# Altium footprint library hphonglib.PcbLib: 1250 footprints (part 38 of 79)
Each footprint in its own frame and in the unit in brackets; x right, y up, seen from the top. Pads: shape width x height; smd on the part's side, far side on the other; paste and mask are expansions set on the pad; w line width, h text height; cw(c..) or ccw(c..) is an arc to the next point about the centre after c.
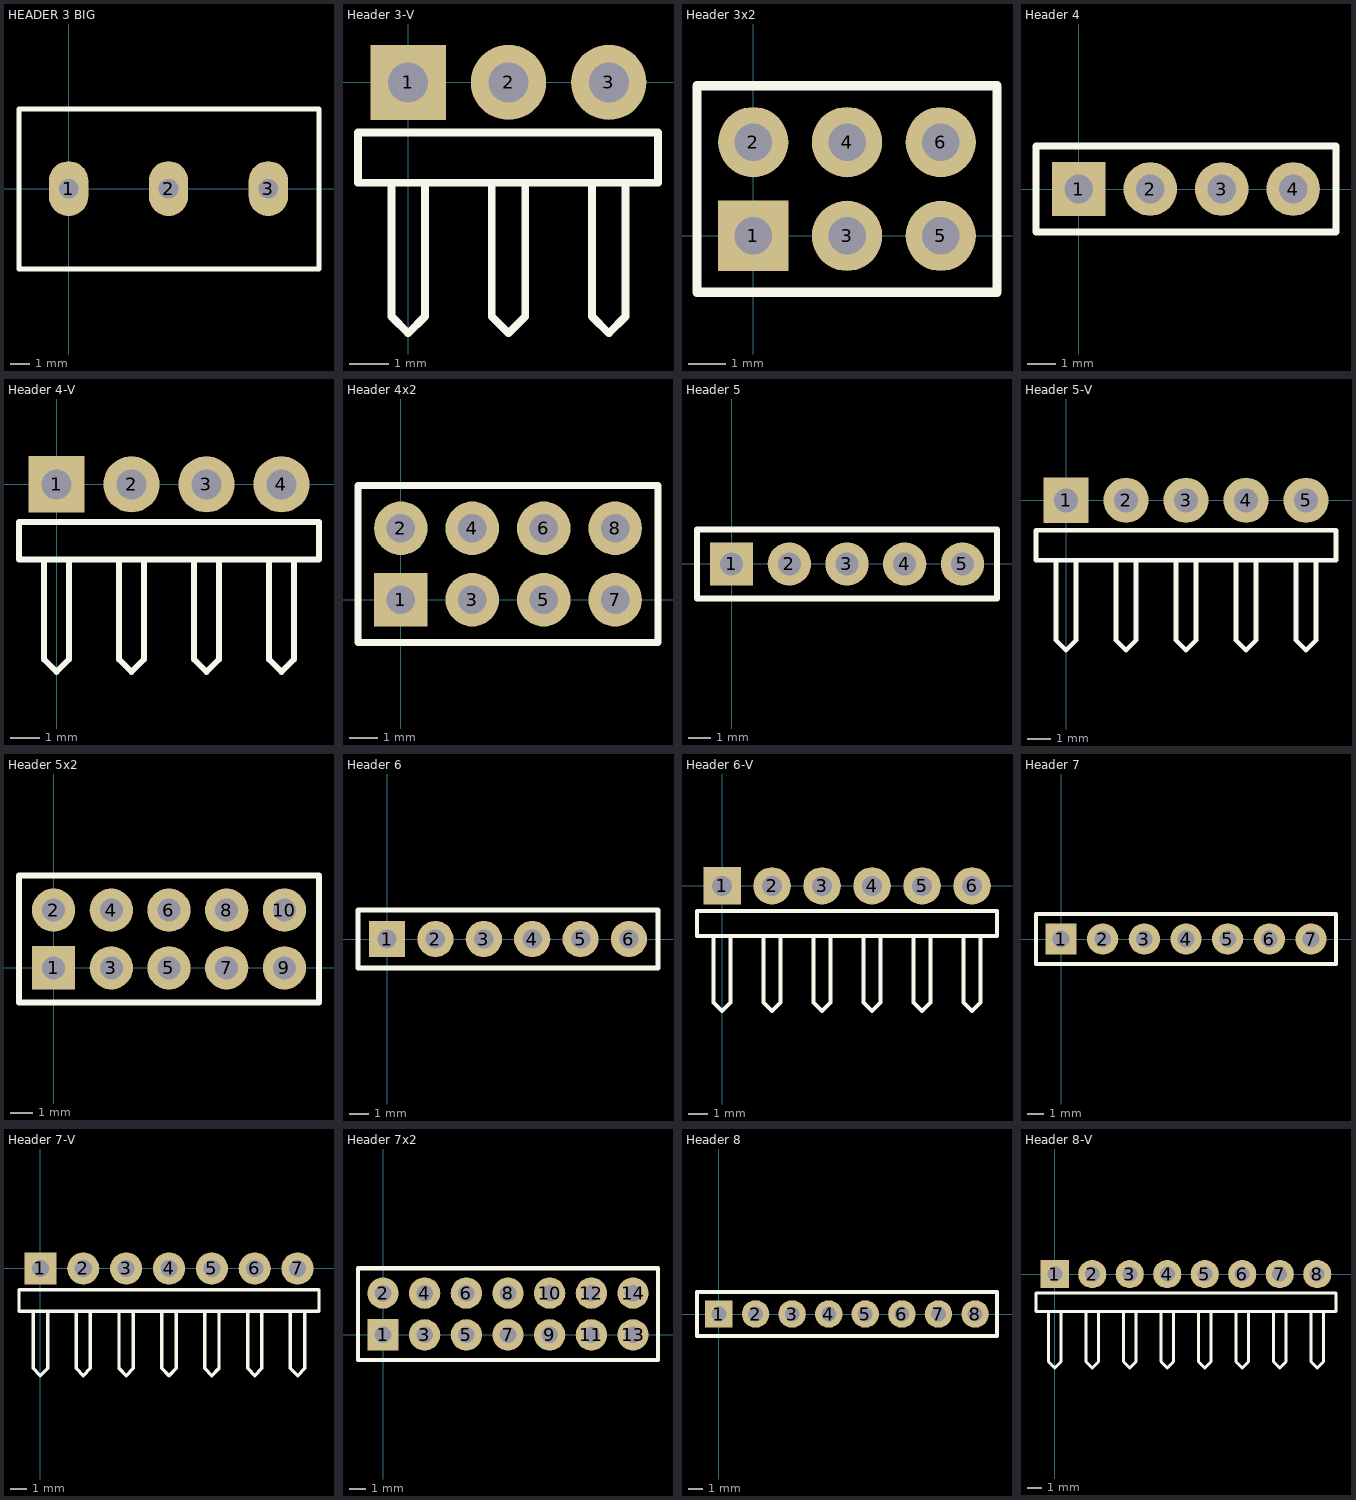
[diagram p37: the footprints below, top view; thin cyan lines are the x and y axes]

## HEADER 3 BIG [mm]
pads (3):
  oval 2x2.8 hole 1: 1(0,0) 2(5.08,0) 3(10.16,0)
Top Overlay:
  lines w0.254: -2.527,-4.102 -2.527,4.064 12.738,4.064 12.738,-4.102 -2.527,-4.102

## Header 3-V [mil] "Connector; Header; 3 Position; Vertical; Solder Pad 35mil"
pads (3):
  rect 75x75 hole 40: 1(0,0)
  round 75 hole 40: 2(100,0) 3(200,0)
Top Overlay:
  lines w7.87: -16.67,-100 -16.67,-233.33 0,-250 16.67,-233.33 16.67,-100 ; 83.33,-100 83.33,-233.33 100,-250 116.67,-233.33 116.67,-100 ; 183.33,-100 183.33,-233.33 200,-250 216.67,-233.33 216.67,-100 ; -50,-100 -50,-50 249,-50 249,-100 -50,-100
3D body "User Library-0_1inch pin strip right angle (2).step": height 171.28, standoff -117.11, extent -50,-275.59 250,50

## Header 3x2 [mil] "Connector; Header; 6 Position; 2 Row; Solder Pad 35mil"
pads (6):
  rect 75x75 hole 40: 1(0,0)
  round 75 hole 40: 2(0,100) 3(100,0) 4(100,100) 5(200,0) 6(200,100)
Top Overlay:
  lines w10: -60,-60 -60,160 260,160 260,-60 -60,-60
3D body "Samtec-TSW-103-07-G-D.step": height 83, standoff -347, extent -49.99,-49.99 250.01,150.01

## Header 4 [mil] "Connector; Header; 4 Position; Solder Pad 35mil"
pads (4):
  rect 75x75 hole 40: 1(0,0)
  round 75 hole 40: 2(100,0) 3(200,0) 4(300,0)
Top Overlay:
  lines w10: -60,-60 360,-60 360,60 -60,60 -60,-60
3D body "Samtec-TSW-104-07-G-S.step": height 330, standoff -100, extent -50,-50 350,50

## Header 4-V [mil] "Connector; Header; 4 Position; Vertical; Solder Pad 35mil"
pads (4):
  rect 75x75 hole 40: 1(0,0)
  round 75 hole 40: 2(100,0) 3(200,0) 4(300,0)
Top Overlay:
  lines w7.87: -16.67,-100 -16.67,-233.33 0,-250 16.67,-233.33 16.67,-100 ; 83.33,-100 83.33,-233.33 100,-250 116.67,-233.33 116.67,-100 ; 183.33,-100 183.33,-233.33 200,-250 216.67,-233.33 216.67,-100 ; 283.33,-100 283.33,-233.33 300,-250 316.67,-233.33 316.67,-100 ; -50,-100 -50,-50 350,-50 350,-100 -50,-100
3D body "User Library-0_1inch pin strip right angle (3).step": height 171.28, standoff -117.11, extent -50,-275.59 350,50

## Header 4x2 [mil] "Connector; Header; 8 Position; 2 Rows; Solder Pad 35mil"
pads (8):
  rect 75x75 hole 40: 1(0,0)
  round 75 hole 40: 2(0,100) 3(100,0) 4(100,100) 5(200,0) 6(200,100) 7(300,0) 8(300,100)
Top Overlay:
  lines w10: -60,-60 -60,160 360,160 360,-60 -60,-60
3D body "Samtec-TSW-104-07-G-D.step": height 83, standoff -347, extent -49.99,-49.99 350.01,150.01

## Header 5 [mil] "Connector; Header; 5 Position; Solder Pad 35mil"
pads (5):
  rect 75x75 hole 40: 1(0,0)
  round 75 hole 40: 2(100,0) 3(200,0) 4(300,0) 5(400,0)
Top Overlay:
  lines w10: -60,-60 460,-60 460,60 -60,60 -60,-60
3D body "Samtec-TSW-105-07-G-S.step": height 83, standoff -347, extent -49.99,-49.99 450.01,50.01

## Header 5-V [mil] "Connector; Header; 5 Position; Vertical; Solder Pad 35mil"
pads (5):
  rect 75x75 hole 40: 1(0,0)
  round 75 hole 40: 2(100,0) 3(200,0) 4(300,0) 5(400,0)
Top Overlay:
  lines w7.87: -16.67,-100 -16.67,-233.33 0,-250 16.67,-233.33 16.67,-100 ; 83.33,-100 83.33,-233.33 100,-250 116.67,-233.33 116.67,-100 ; 183.33,-100 183.33,-233.33 200,-250 216.67,-233.33 216.67,-100 ; 283.33,-100 283.33,-233.33 300,-250 316.67,-233.33 316.67,-100 ; 383.33,-100 383.33,-233.33 400,-250 416.67,-233.33 416.67,-100 ; -50,-100 450,-100 450,-50 -50,-50 -50,-100
3D body "User Library-0_1inch pin strip right angle (4).step": height 171.28, standoff -117.11, extent -50,-275.59 450,50

## Header 5x2 [mil] "Connector; Header; 10 Position; 2 Rows; Solder Pad 35mil"
pads (10):
  rect 75x75 hole 40: 1(0,0)
  round 75 hole 40: 2(0,100) 3(100,0) 4(100,100) 5(200,0) 6(200,100) 7(300,0) 8(300,100) 9(400,0) 10(400,100)
Top Overlay:
  lines w10: -60,-60 460,-60 460,160 -60,160 -60,-60
3D body "Samtec-TSW-105-07-G-D.step": height 83, standoff -347, extent -49.99,-50 450.01,150

## Header 6 [mil] "Connector; Header; 6 Position; Solder Pad 35mil"
pads (6):
  rect 75x75 hole 40: 1(0,0)
  round 75 hole 40: 2(100,0) 3(200,0) 4(300,0) 5(400,0) 6(500,0)
Top Overlay:
  lines w10: -60,-60 -60,60 560,60 560,-60 -60,-60
3D body "Samtec-TSW-106-07-G-S.step": height 330, standoff -100, extent -49.99,-49.99 550.01,50.01

## Header 6-V [mil] "Connector; Header; 6 Position; Vertical; Solder Pad 35mil"
pads (6):
  rect 75x75 hole 40: 1(0,0)
  round 75 hole 40: 2(100,0) 3(200,0) 4(300,0) 5(400,0) 6(500,0)
Top Overlay:
  lines w7.87: -16.67,-100 -16.67,-233.33 0,-250 16.67,-233.33 16.67,-100 ; 83.33,-100 83.33,-233.33 100,-250 116.67,-233.33 116.67,-100 ; 183.33,-100 183.33,-233.33 200,-250 216.67,-233.33 216.67,-100 ; 283.33,-100 283.33,-233.33 300,-250 316.67,-233.33 316.67,-100 ; 383.33,-100 383.33,-233.33 400,-250 416.67,-233.33 416.67,-100 ; 483.33,-100 483.33,-233.33 500,-250 516.67,-233.33 516.67,-100 ; -50,-100 -50,-50 550,-50 550,-100 -50,-100
3D body "User Library-0_1inch pin strip right angle (5).step": height 171.28, standoff -117.11, extent -50,-275.59 550,50

## Header 7 [mil] "Connector; Header; 7 Position; Solder Pad 35mil"
pads (7):
  rect 75x75 hole 40: 1(0,0)
  round 75 hole 40: 2(100,0) 3(200,0) 4(300,0) 5(400,0) 6(500,0) 7(600,0)
Top Overlay:
  lines w10: -60,-60 660,-60 660,60 -60,60 -60,-60
3D body "Samtec-TSW-107-07-G-S.step": height 330, standoff -100, extent -49.99,-50 650.01,50

## Header 7-V [mil] "Connector; Header; 7 Position; Vertical; Solder Pad 35mil"
pads (7):
  rect 75x75 hole 40: 1(0,0)
  round 75 hole 40: 2(100,0) 3(200,0) 4(300,0) 5(400,0) 6(500,0) 7(600,0)
Top Overlay:
  lines w7.87: -16.67,-100 -16.67,-233.33 0,-250 16.67,-233.33 16.67,-100 ; 83.33,-100 83.33,-233.33 100,-250 116.67,-233.33 116.67,-100 ; 183.33,-100 183.33,-233.33 200,-250 216.67,-233.33 216.67,-100 ; 283.33,-100 283.33,-233.33 300,-250 316.67,-233.33 316.67,-100 ; 383.33,-100 383.33,-233.33 400,-250 416.67,-233.33 416.67,-100 ; 483.33,-100 483.33,-233.33 500,-250 516.67,-233.33 516.67,-100 ; 583.33,-100 583.33,-233.33 600,-250 616.67,-233.33 616.67,-100 ; -50,-100 -50,-50 650,-50 650,-100 -50,-100
3D body "User Library-0_1inch pin strip right angle (6).step": height 171.28, standoff -117.11, extent -50,-275.59 650,50

## Header 7x2 [mil] "Connector; Header; 14 Position; 2 Rows; Solder Pad 35mil"
pads (14):
  rect 75x75 hole 40: 1(0,0)
  round 75 hole 40: 2(0,100) 3(100,0) 4(100,100) 5(200,0) 6(200,100) 7(300,0) 8(300,100) 9(400,0) 10(400,100) 11(500,0) 12(500,100) 13(600,0) 14(600,100)
Top Overlay:
  lines w10: -60,-60 -60,160 660,160 660,-60 -60,-60
3D body "Samtec-TSW-107-07-G-D.step": height 83, standoff -347, extent -49.99,-49.99 650.01,150.01

## Header 8 [mil] "Connector; Header; 8 Position; Solder Pad 35mil"
pads (8):
  rect 75x75 hole 40: 1(0,0)
  round 75 hole 40: 2(100,0) 3(200,0) 4(300,0) 5(400,0) 6(500,0) 7(600,0) 8(700,0)
Top Overlay:
  lines w10: -60,-60 -60,60 760,60 760,-60 -60,-60
3D body "Samtec-TSW-108-07-G-S.step": height 330, standoff -100, extent -50,-49.99 750,50.01

## Header 8-V [mil] "Connector; Header; 8 Position; Vertical; Solder Pad 35mil"
pads (8):
  rect 75x75 hole 40: 1(0,0)
  round 75 hole 40: 2(100,0) 3(200,0) 4(300,0) 5(400,0) 6(500,0) 7(600,0) 8(700,0)
Top Overlay:
  lines w7.87: -16.67,-100 -16.67,-233.33 0,-250 16.67,-233.33 16.67,-100 ; 83.33,-100 83.33,-233.33 100,-250 116.67,-233.33 116.67,-100 ; 183.33,-100 183.33,-233.33 200,-250 216.67,-233.33 216.67,-100 ; 283.33,-100 283.33,-233.33 300,-250 316.67,-233.33 316.67,-100 ; 383.33,-100 383.33,-233.33 400,-250 416.67,-233.33 416.67,-100 ; 483.33,-100 483.33,-233.33 500,-250 516.67,-233.33 516.67,-100 ; 583.33,-100 583.33,-233.33 600,-250 616.67,-233.33 616.67,-100 ; 683.33,-100 683.33,-233.33 700,-250 716.66,-233.33 716.66,-100 ; -50,-100 750,-100 750,-50 -50,-50 -50,-100
3D body "User Library-0_1inch pin strip right angle (7).step": height 171.28, standoff -117.11, extent -50,-275.59 750,50